# Altium footprint library MS-Electronic.PcbLib: 213 footprints (part 3 of 14)
Each footprint in its own frame and in the unit in brackets; x right, y up, seen from the top. Pads: shape width x height; smd on the part's side, far side on the other; paste and mask are expansions set on the pad; w line width, h text height; cw(c..) or ccw(c..) is an arc to the next point about the centre after c.
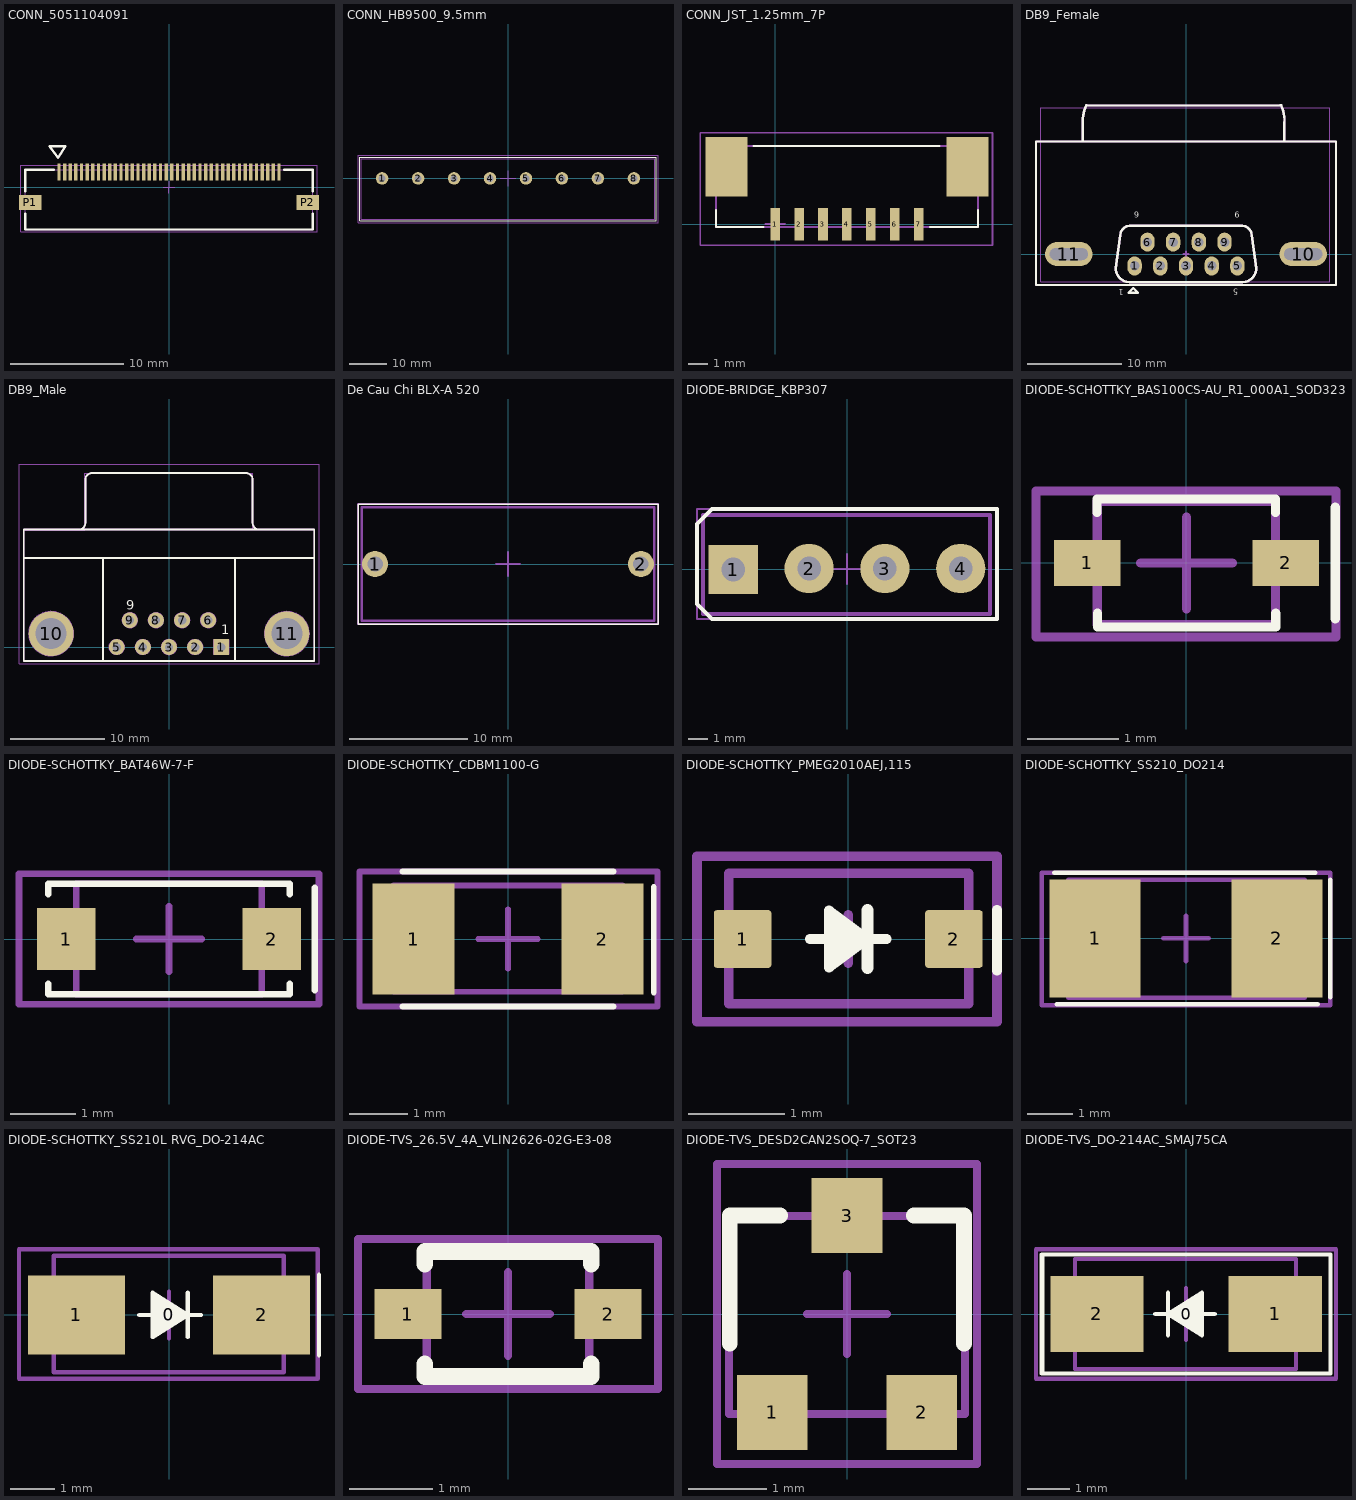
[diagram p2: the footprints below, top view; thin cyan lines are the x and y axes]

## CONN_5051104091 [mm]
pads (42):
  rect 0.3x1.5 smd paste+0 mask+0.025: 1(-9.75,1.35) 2(-9.25,1.35) 3(-8.75,1.35) 4(-8.25,1.35) 5(-7.75,1.35) 6(-7.25,1.35) 7(-6.75,1.35) 8(-6.25,1.35) 9(-5.75,1.35) 10(-5.25,1.35) 11(-4.75,1.35) 12(-4.25,1.35) 13(-3.75,1.35) 14(-3.25,1.35) 15(-2.75,1.35) 16(-2.25,1.35) 17(-1.75,1.35) 18(-1.25,1.35) 19(-0.75,1.35) 20(-0.25,1.35) 21(0.25,1.35) 22(0.75,1.35) 23(1.25,1.35) 24(1.75,1.35) 25(2.25,1.35) 26(2.75,1.35) 27(3.25,1.35) 28(3.75,1.35) 29(4.25,1.35) 30(4.75,1.35) 31(5.25,1.35) 32(5.75,1.35) 33(6.25,1.35) 34(6.75,1.35) 35(7.25,1.35) 36(7.75,1.35) 37(8.25,1.35) 38(8.75,1.35) 39(9.25,1.35) 40(9.75,1.35)
  rect 2x1.3 smd paste+0 mask+0.025: P1(-12.294,-1.346) P2(12.294,-1.346)
Top Overlay:
  lines w0.2: -12.75,-2.32 -12.75,-3.75 12.75,-3.75 12.75,-2.32 ; -12.75,-0.38 -12.75,1.55 -10.22,1.55 ; 10.22,1.55 12.75,1.55 12.75,-0.38 ; -10.591,3.636 -9.194,3.636 -9.829,2.62 -10.591,3.636
Top Assembly:
  lines w0.1: -12.751,-3.759 12.751,-3.759 12.751,1.549 -12.751,1.549 -12.751,-3.759
  lines w0.127: -10.591,3.636 -9.194,3.636 -9.829,2.62 -10.591,3.636
  text "'.Designator'" at -3.947,-0.383 h1.78
Top Component Center (Mech15):
  lines w0.1: -0.511,0.021 -0.003,0.021 ; 0,-0.508 0,0 ; 0.001,0.016 0.001,0.524 ; 0.006,0.012 0.514,0.012 ; -13.132,-3.937 -13.132,-0.686 -13.132,1.964 13.157,1.964 13.157,-3.937 -13.132,-3.937
3D body "5051104091.stp": height 1.88, standoff -0.02, extent -12.75,-3.746 12.75,1.554

## CONN_HB9500_9.5mm [mm]
pads (8):
  round 3.3 hole 1.8: 1(-33.25,0) 2(-23.75,0) 3(-14.25,0) 4(-4.75,0) 5(4.75,0) 6(14.25,0) 7(23.75,0) 8(33.25,0)
Top Overlay:
  lines w0.2: -39.116,-11.176 39.116,-11.176 39.116,5.588 -39.116,5.588 -39.116,-11.176
Top Assembly:
  lines w0.1: -38.76,-10.778 38.748,-10.778 38.748,5.241 -38.76,5.241 -38.76,-10.778
  text ".Designator" at -4.998,-0.333 h1
Top Component Center (Mech15):
  lines w0.2: -2.032,0 0,0 ; 0,-2.032 0,0 ; 0,2.032 0,0 ; 2.032,0 0,0 ; -39.624,-11.684 39.624,-11.684 39.624,6.096 -39.624,6.096 -39.624,-11.684
3D body "HB9500_01x08_P9.50mm.step": height 18.2, standoff -7.8, extent -38.766,-10.769 38.734,5.231

## CONN_JST_1.25mm_7P [mm]
pads (9):
  rect 0.5x1.7 smd: 1(0,0) 2(1.25,0) 3(2.5,0) 4(3.75,0) 5(5,0) 6(6.25,0) 7(7.5,0)
  rect 2.2x3.1 smd: ""(-2.537,3.003) ""(10.05,3.003)
Top Overlay:
  lines w0.1: -3.099,0.741 -3.099,-0.155 -0.599,-0.155 ; -1.13,4.083 8.588,4.083 ; 8.099,-0.155 10.611,-0.155 10.611,0.741
Top Assembly:
  lines w0.1: -3.096,-0.152 -3.096,4.084 10.617,4.084 10.617,-0.152 -3.096,-0.152
  text ".Designator" at -2.499,-0.167 h0.5
Top Component Center (Mech15):
  lines w0.1: -0.508,0 0,0 ; 0,-0.508 0,0 ; 0,0.508 0,0 ; 0.508,0 0,0 ; -3.916,-1.103 -3.916,4.781 11.37,4.781 11.37,-1.103 -3.916,-1.103
3D body "JST - GH - SMD (V) - 7Pin - 1.25mm.stp": height 4.66, standoff 0, extent -3.089,-0.165 10.608,4.077

## DB9_Female [mil]
pads (11):
  oval 60x80 hole 40: 1(-215.75,-50) 2(-107.87,-50) 3(0,-50) 4(107.87,-50) 5(215.75,-50) 6(-161.81,50) 7(-53.94,50) 8(53.94,50) 9(161.81,50)
  oval 200x100 hole 50 slot 160 at 0 deg: 10(492.13,0) 11(-492.13,0)
Top Overlay:
  lines w10: -433.07,472.44 -433.07,570.87 cw(c-285.43,561.02) -419.17,624.34 ; -420.02,623.39 395,625 ; -236.22,118.11 236.07,118.11 ; -236.07,118.26 ccw(c-236.07,78.74) -275.59,78.74 -295.28,-59.06 ccw(c-236.22,-59.06) -236.22,-118.11 236.22,-118.11 ccw(c236.22,-59.06) 295.28,-59.06 275.59,78.74 ccw(c236.07,78.74) 236.07,118.26 ; 399.24,624.85 cw(c265.75,561.02) 413.39,551.18 413.39,472.44 ; -221.54,-142.91 -201.85,-162.6 -241.22,-162.6 -221.54,-142.91 ; -221.54,-142.91 -221.54,-142.91 ; -629.92,-130 629.92,-130 629.92,0 629.92,472.44 -629.92,472.44 -629.92,-130
  text "1" at -260.91,-146.85 h25
  text "5" at 220,-145 h25
  text "9" at 226.38,177.17 h25
  text "6" at -196.85,177.17 h25
Top Assembly:
  lines w3.94: -609.39,-115.42 -609.39,614.97 602.64,614.97 602.64,-115.42 -609.39,-115.42
  text ".Designator" at -118.07,-7.87 h23.62
Top Component Center (Mech15):
  lines w10: -433.07,472.44 -433.07,570.87 cw(c-285.43,561.02) -419.61,623.39 ; -415,625 400.02,623.4 ; -236.22,118.11 236.07,118.11 ; -236.07,118.26 ccw(c-236.07,78.74) -275.59,78.74 -295.28,-59.06 ccw(c-236.22,-59.06) -236.22,-118.11 236.22,-118.11 ccw(c236.22,-59.06) 295.28,-59.06 275.59,78.74 ccw(c236.07,78.74) 236.07,118.26 ; -9.84,0 9.84,0 ; 0,-9.84 0,9.84 ; 399.24,624.85 cw(c265.75,561.02) 413.39,551.18 413.39,472.44 ; -629.92,-130 -629.92,472.44 629.92,472.44 629.92,0 629.92,-130 -629.92,-130
3D body "DB9 - 203-09SCKKBE.STEP": height 501.97, standoff -167.32, extent -610,-114.99 603,615.32

## DB9_Male [mm]
pads (11):
  rect 1.69x1.69 hole 0.9: 1(5.54,0)
  round 1.69 hole 0.9: 2(2.77,0) 3(0,0) 4(-2.77,0) 5(-5.54,0) 6(4.155,2.84) 7(1.385,2.84) 8(-1.385,2.84) 9(-4.155,2.84)
  round 4.76 hole 3.3: 10(-12.495,1.42) 11(12.495,1.42)
Top Overlay:
  lines w0.2: -15.4,9.444 15.4,9.444 ; -9.56,12.449 ccw(c-9.56,13.144) -8.865,13.144 -8.865,17.744 ; -8.86,17.749 cw(c-8.165,17.749) -8.165,18.444 8.165,18.444 cw(c8.165,17.749) 8.86,17.749 ; -7,-1.48 -7,9.444 ; 7,-1.48 7,9.444 ; 8.865,17.744 8.865,13.144 ccw(c9.56,13.144) 9.56,12.449 ; -15.4,-1.48 -15.4,12.444 15.4,12.444 15.4,-1.48 -15.4,-1.48
  text "1" at 5.555,1.34 h1
  text "9" at -4.554,3.935 h1
Top Assembly:
  lines w0.1: -15.394,-1.5 15.4,-1.5 15.4,12.442 8.9,12.442 8.9,18.442 -8.908,18.442 -8.908,12.4 -15.394,12.4 -15.394,-1.5
  text ".Designator" at -2.999,-0.2 h0.6
Mechanical 7:
  circle w0.2: c2.77,0 r0.773
  circle w0.2: c0,0 r0.773
  circle w0.2: c-2.77,0 r0.773
  circle w0.2: c-5.54,0 r0.773
  circle w0.2: c-4.155,2.84 r0.773
  circle w0.2: c-1.385,2.84 r0.773
  circle w0.2: c1.385,2.84 r0.773
  circle w0.2: c4.155,2.84 r0.773
  circle w0.2: c12.495,1.42 r2.327
  circle w0.2: c-12.495,1.42 r2.327
  lines w0.2: -15.4,9.444 15.4,9.444 ; -9.56,12.449 ccw(c-9.56,13.144) -8.865,13.144 -8.865,17.744 ; -8.86,17.749 cw(c-8.165,17.749) -8.165,18.444 8.165,18.444 cw(c8.165,17.749) 8.86,17.749 ; -7,-1.48 -7,9.444 ; 7,-1.48 7,9.444 ; 8.865,17.744 8.865,13.144 ccw(c9.56,13.144) 9.56,12.449 ; -15.4,-1.48 15.4,-1.48 15.4,12.444 -15.4,12.444 -15.4,-1.48 ; 4.79,-0.75 6.29,-0.75 6.29,0.75 4.79,0.75 4.79,0 4.79,-0.75
Top Component Center (Mech15):
  lines w0.1: -0.9,0 0,0 ; 0,-0.9 0,0 ; 0,0.9 0,0 ; 0.9,0 0,0 ; -15.9,-1.8 -15.9,19.4 15.9,19.4 15.9,-1.8 -15.9,-1.8
3D body: height 4, standoff -3, extent -13.912,1.291 -12.967,1.745
3D body: height 4, standoff -3, extent -12.144,1.199 -11.077,1.928
3D body: height 4, standoff -3, extent 11.069,1.303 12.136,2.032
3D body: height 4, standoff -3, extent 12.959,1.486 13.904,1.941
3D body: height 4.5, standoff 4, extent 10.781,1.948 14.324,8.629
3D body: height 4.5, standoff 4, extent -14.373,1.727 -10.83,8.408
3D body "SW3DPS-DB9RA_copy.STEP": height 12.66, standoff -3.39, extent -15.693,-1.488 15.621,19.216

## De Cau Chi BLX-A 520 [mm] "PCB - Clip Cover - THR"
height 12.6
pads (2):
  round 2.2 hole 1.3: 1(-11.25,0) 2(11.25,0)
Top Overlay:
  lines w0.127: -12.7,-5.08 12.7,-5.08 12.7,5.08 -12.7,5.08 -12.7,-5.08
Top Assembly:
  lines w0.2: -12.395,-4.801 -12.395,4.809 12.395,4.809 12.395,-4.801 -12.395,-4.801
  text ".Designator" at -4.998,-0.333 h1
Top Component Center (Mech15):
  lines w0.2: -1.016,0 0,0 ; 0,-1.016 0,0 ; 0,1.016 0,0 ; 1.016,0 0,0 ; -12.7,-5.08 -12.7,5.08 12.7,5.08 12.7,-5.08 -12.7,-5.08
3D body "696103201002.stp": height 25, standoff -4.1, extent -12.4,-4.8 12.4,4.8

## DIODE-BRIDGE_KBP307 [mm]
height 20.32
pads (4):
  rect 2.5x2.5 hole 1.2: 1(-5.775,-0.025)
  round 2.5 hole 1.2: 2(-1.925,0.025) 3(1.925,0.025) 4(5.775,0.025)
Top Overlay:
  lines w0.2: -7.62,-1.778 -7.62,2.286 -6.858,3.048 7.62,3.048 7.62,-2.54 -6.858,-2.54 -7.62,-1.778
Top Assembly:
  lines w0.2: -7.315,-2.286 -7.315,2.743 7.264,2.743 7.264,-2.286 -7.315,-2.286
  text ".Designator" at -4.998,-0.333 h1
Top Component Center (Mech15):
  lines w0.1: -0.762,0 0,0 ; 0,-0.762 0,0 ; 0,0.762 0,0 ; 0.762,0 0,0 ; -7.62,-2.54 -7.62,3.048 7.62,3.048 7.62,-2.54 -7.62,-2.54
3D body "SW3dPS-KBPM.STEP": height 11.5, standoff -12.7, extent -7.324,-2.267 7.255,2.743

## DIODE-SCHOTTKY_BAS100CS-AU_R1_000A1_SOD323 [mm]
height 0.9
pads (2):
  rect 0.73x0.5 smd: 1(-1.085,0) 2(1.085,0)
Top Overlay:
  lines w0.1: -0.976,0.55 -0.976,0.7 0.974,0.7 0.974,0.55 ; -0.974,-0.55 -0.974,-0.7 0.976,-0.7 0.976,-0.55 ; 1.626,-0.61 1.626,0.61
Top Assembly:
  lines w0.1: -0.975,-0.675 0.975,-0.675 0.975,0.675 -0.975,0.675 -0.975,-0.675
  text ".Designator" at -2.499,-0.167 h0.5
Top Component Center (Mech15):
  lines w0.1: -0.5,0 0.5,0 ; 0,-0.5 0,0.5 ; -1.644,-0.808 1.634,-0.808 1.634,0.786 -1.644,0.786 -1.644,-0.808
3D body "DIODE-SCHOTTKY_BAS100CS-AU_R1_000A1_SOD323.step": height 0.9, standoff 0, extent -1.25,-0.675 1.25,0.675

## DIODE-SCHOTTKY_BAT46W-7-F [mm]
height 1.35
pads (2):
  rect 0.9x0.95 smd: 1(-1.575,0) 2(1.575,0)
Top Overlay:
  lines w0.1: -1.851,-0.85 -1.851,-0.848 ; -1.851,-0.686 -1.851,-0.848 ; -1.85,0.686 -1.85,0.848 1.851,0.848 ; 1.85,-0.686 1.85,-0.848 -1.851,-0.848 ; 1.851,0.686 1.851,0.848 ; 1.851,0.85 1.851,0.848 ; 2.235,-0.787 2.235,0.787
Top Assembly:
  lines w0.1: -1.425,-0.85 -1.425,0.85 1.425,0.85 1.425,-0.85 -1.425,-0.85
  text ".Designator" at -2.499,-0.167 h0.5
Top Component Center (Mech15):
  lines w0.1: -0.5,0 0.5,0 ; 0,-0.5 0,0.5 ; -2.3,-1 -2.3,1 2.3,1 2.3,-1 -2.3,-1
3D body "A.step": height 1.35, standoff 0, extent -1.85,-0.85 1.85,0.85

## DIODE-SCHOTTKY_CDBM1100-G [mm]
pads (2):
  rect 1.4x1.9 smd paste+0: 1(-1.613,0) 2(1.613,0)
Top Overlay:
  lines w0.1: -1.803,-1.156 1.803,-1.156 ; -1.803,1.156 1.803,1.156 ; 2.489,-0.912 2.489,0.889
Top Assembly:
  lines w0.1: -1.956,-0.901 1.957,-0.901 1.957,0.914 -1.956,0.914 -1.956,-0.901
  text ".Designator" at -2.499,-0.167 h0.5
Top Component Center (Mech15):
  lines w0.1: -0.508,0 0,0 ; 0,-0.508 0,0 ; 0,0.508 0,0 ; 0.508,0 0,0 ; -2.537,-1.156 -1.803,-1.156 1.803,-1.156 2.552,-1.156 2.552,1.156 1.803,1.156 -1.803,1.156 -2.537,1.156 -2.537,-1.156
3D body "CDBM.step": height 0.82, standoff 0, extent -1.956,-0.902 1.956,0.902

## DIODE-SCHOTTKY_PMEG2010AEJ,115 [mm]
pads (2):
  rrect10% 0.6x0.6 smd mask+0.05: 1(-1.1,0) 2(1.1,0)
Top Overlay:
  region: -0.2,-0.3 -0.2,0.3 0.2,0
  lines w0.1: -0.4,0 -0.2,0 ; 0.4,0 0.2,0 ; 1.549,-0.33 1.549,0.305 ; 0.2,0 -0.2,-0.3 -0.2,0.3 0.2,0
  lines w0.127: 0.2,-0.3 0.2,0.3
Top Assembly:
  lines w0.1: -1.245,-0.676 1.254,-0.676 1.254,0.686 -1.245,0.686 -1.245,-0.676
  text ".Designator" at -1.5,-0.1 h0.3
Top Component Center (Mech15):
  lines w0.1: -0.254,0 0.254,0 ; 0,-0.254 0,0.254 ; -1.575,-0.864 1.549,-0.864 1.549,0.864 -1.575,0.864 -1.575,-0.864
3D body "SOD323F.STEP": height 1, standoff 0, extent -1.25,-0.675 1.25,0.675

## DIODE-SCHOTTKY_SS210_DO214 [mm] "DO214"
pads (2):
  rect 2x2.6 smd mask+0.05: 1(-2,0) 2(2,0)
Top Overlay:
  lines w0.1: -2.896,1.448 2.845,1.448 ; -2.845,-1.448 2.896,-1.448 ; 3.175,-1.295 3.175,1.295
Top Assembly:
  region: 2.611,1.295 2.103,1.295 2.103,-1.303 2.611,-1.303
  lines w0.1: -2.591,-1.303 2.611,-1.303 2.611,1.295 -2.591,1.295 -2.591,-1.303
  text ".Designator" at -2.499,-0.167 h0.5
Top Component Center (Mech15):
  lines w0.1: -0.5,0 0.5,0 ; 0,-0.5 0,0.5 ; -3.175,-1.473 3.175,-1.473 3.175,1.448 -3.175,1.448 -3.175,-1.473
3D body "SMA_nominal.stp": height 2.42, standoff 0.02, extent -2.6,-1.3 2.6,1.3

## DIODE-SCHOTTKY_SS210L RVG_DO-214AC [mm]
pads (3):
  round 0.508 on Mech14: 0(0,0)
  rect 2.2x1.8 smd mask+0.07: 1(-2.1,0) 2(2.1,0)
Top Overlay:
  region: -0.375,0.5 -0.375,-0.5 0.425,0
  lines w0.1: -0.675,0 -0.375,0 ; 0.425,-0.5 0.425,0 ; 0.425,0.5 0.425,0 ; 0.725,0 0.425,0 ; 3.404,-0.914 3.404,0.914 ; 0.425,0 -0.375,-0.5 -0.375,0.5 0.425,0
Top Assembly:
  lines w0.1: -2.616,-1.299 2.601,-1.299 2.601,1.346 -2.616,1.346 -2.616,-1.299
  text ".Designator" at -2.499,-0.167 h0.5
Top Component Center (Mech15):
  lines w0.1: -0.533,0 0,0 ; 0,-0.533 0,0 ; 0,0.533 0,0 ; 0.533,0 0,0 ; -3.404,-1.448 3.378,-1.448 3.378,1.492 -3.404,1.492 -3.404,-1.448
3D body "SW3dPS-DO-214AC SMA.STEP": height 2.42, standoff 0.02, extent -2.6,-1.3 2.6,1.3

## DIODE-TVS_26.5V_4A_VLIN2626-02G-E3-08 [mm]
height 1.15
pads (2):
  rect 0.8x0.6 smd: 1(-1.2,0) 2(1.2,0)
Top Overlay:
  lines w0.2: -1,-0.6 -1,-0.75 1,-0.75 1,-0.6 ; -1,0.6 -1,0.75 1,0.75 1,0.6
Top Assembly:
  lines w0.1: -0.975,-0.75 -0.975,0.75 0.975,0.75 0.975,-0.75 -0.975,-0.75
  text ".Designator" at -2.499,-0.167 h0.5
Top Component Center (Mech15):
  lines w0.1: -0.5,0 0.5,0 ; 0,-0.5 0,0.5 ; -1.8,-0.9 -1.8,0.9 1.8,0.9 1.8,-0.9 -1.8,-0.9
3D body "DIODE-TVS_26.5V_4A_VLIN2626-02G-E3-08.step": height 1.15, standoff 0, extent -1.338,-0.75 1.338,0.75

## DIODE-TVS_DESD2CAN2SOQ-7_SOT23 [mm]
pads (3):
  rect 0.9x0.95 smd mask+0.07: 1(-0.95,-1.25) 2(0.95,-1.25) 3(0,1.25)
Top Overlay:
  lines w0.2: -1.49,-0.375 -1.49,1.25 -0.85,1.25 ; 0.85,1.25 1.484,1.25 1.484,-0.375
Top Assembly:
  lines w0.1: -1.499,-1.27 1.499,-1.27 1.499,1.245 -1.499,1.245 -1.499,-1.27
  text ".Designator" at -2.999,-0.2 h0.6
Mechanical 7:
Top Component Center (Mech15):
  lines w0.1: -0.508,0 0,0 ; 0,-0.508 0,0 ; 0,0.508 0,0 ; 0.508,0 0,0 ; -1.651,-1.905 1.651,-1.905 1.651,1.905 -1.651,1.905 -1.651,-1.905
3D body "SW3DPS-SOT-23-DEFAULT.STEP": height 1.06, standoff -0.04, extent -1.5,-1.25 1.5,1.25

## DIODE-TVS_DO-214AC_SMAJ75CA [mm]
pads (3):
  round 0.508 on Mech14: 0(0,0)
  rect 2.2x1.8 smd: 1(2.1,0) 2(-2.1,0)
Top Overlay:
  region: 0.375,-0.5 0.375,0.5 -0.425,0
  lines w0.1: -3.387,-1.4 -3.387,1.4 ; -0.725,0 -0.425,0 ; -0.425,-0.5 -0.425,0 ; -0.425,0.5 -0.425,0 ; 0.375,0 0.675,0 ; -0.425,0 0.375,0.5 0.375,-0.5 -0.425,0 ; -3.4,-1.4 -3.4,1.4 3.4,1.4 3.4,-1.4 -3.4,-1.4
Top Assembly:
  lines w0.1: -2.616,-1.295 2.591,-1.295 2.591,1.295 -2.616,1.295 -2.616,-1.295
  text ".Designator" at -2.999,-0.2 h0.6
Top Component Center (Mech15):
  lines w0.1: -0.61,0 0,0 ; 0,-0.61 0,0 ; 0.61,0 0,0 ; 0,0 0,0.61 ; 0,0.61 0,0.61 ; -3.536,-1.524 3.532,-1.524 3.532,1.524 -3.536,1.524 -3.536,-1.524
3D body "SW3dPS-DO-214AC SMA.STEP": height 2.42, standoff 0.02, extent -2.6,-1.3 2.6,1.3